# Altium footprint library con-samtec.PCBLIB: 805 footprints (part 5 of 55)
Each footprint in its own frame and in the unit in brackets; x right, y up, seen from the top. Pads: shape width x height; smd on the part's side, far side on the other; paste and mask are expansions set on the pad; w line width, h text height; cw(c..) or ccw(c..) is an arc to the next point about the centre after c.
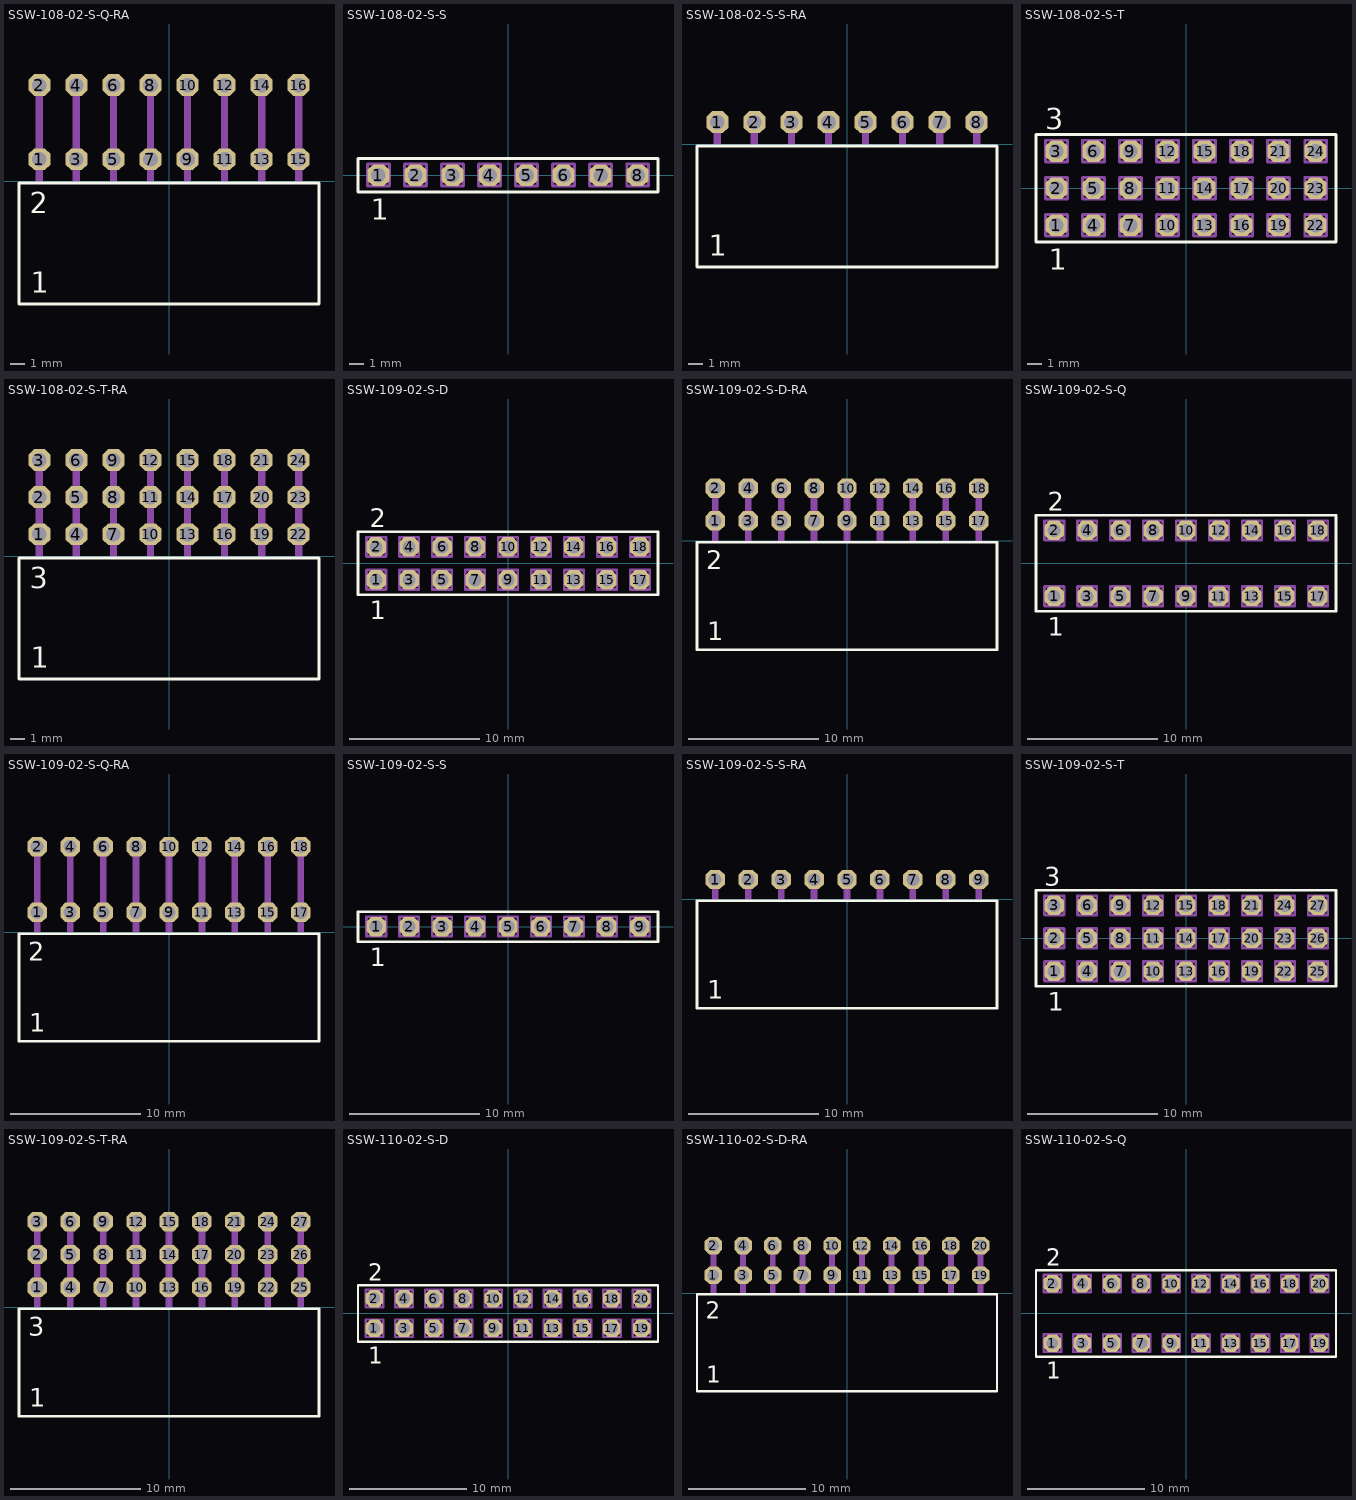
[diagram p4: the footprints below, top view; thin cyan lines are the x and y axes]

## SSW-108-02-S-Q-RA [mil]
pads (16):
  oct 59.06x59.06 hole 39.37: 1(-350,60) 2(-350,260) 3(-250,60) 4(-250,260) 5(-150,60) 6(-150,260) 7(-50,60) 8(-50,260) 9(50,60) 10(50,260) 11(150,60) 12(150,260) 13(250,60) 14(250,260) 15(350,60) 16(350,260)
Top Overlay:
  lines w8: -405.08,-330.55 405.08,-330.55 405.08,-4.17 -405.08,-4.17 -405.08,-330.55
  text "1" at -373.43,-301.18 h56.1
  text "2" at -376.38,-86.61 h56.1
Mechanical 16:
  rectangle: -360,0 -340,270
  rectangle: -260,0 -240,270
  rectangle: -160,0 -140,270
  rectangle: -60,0 -40,270
  rectangle: 40,0 60,270
  rectangle: 140,0 160,270
  rectangle: 240,0 260,270
  rectangle: 340,0 360,270

## SSW-108-02-S-S [mm]
pads (8):
  oct 1.5x1.5 hole 1: 1(-8.89,0) 2(-6.35,0) 3(-3.81,0) 4(-1.27,0) 5(1.27,0) 6(3.81,0) 7(6.35,0) 8(8.89,0)
Top Overlay:
  lines w0.203: -10.289,-1.155 10.289,-1.155 10.289,1.155 -10.289,1.155 -10.289,-1.155
  text "1" at -9.398,-3.048 h1.42
Mechanical 16:
  lines w0.203: -9.635,-0.745 -8.135,-0.745 -8.135,0.755 -9.635,0.755 -9.635,-0.745 ; -7.095,-0.745 -5.595,-0.745 -5.595,0.755 -7.095,0.755 -7.095,-0.745 ; -4.555,-0.745 -3.055,-0.745 -3.055,0.755 -4.555,0.755 -4.555,-0.745 ; -2.015,-0.745 -0.515,-0.745 -0.515,0.755 -2.015,0.755 -2.015,-0.745 ; 0.525,-0.745 2.025,-0.745 2.025,0.755 0.525,0.755 0.525,-0.745 ; 3.065,-0.745 4.565,-0.745 4.565,0.755 3.065,0.755 3.065,-0.745 ; 5.605,-0.745 7.105,-0.745 7.105,0.755 5.605,0.755 5.605,-0.745 ; 8.145,-0.745 9.645,-0.745 9.645,0.755 8.145,0.755 8.145,-0.745

## SSW-108-02-S-S-RA [mil]
pads (8):
  oct 59.06x59.06 hole 39.37: 1(-350,60) 2(-250,60) 3(-150,60) 4(-50,60) 5(50,60) 6(150,60) 7(250,60) 8(350,60)
Top Overlay:
  lines w8: -405.08,-330.55 405.08,-330.55 405.08,-4.17 -405.08,-4.17 -405.08,-330.55
  text "1" at -373.43,-301.18 h56.1
Mechanical 16:
  rectangle: -360,0 -340,70
  rectangle: -260,0 -240,70
  rectangle: -160,0 -140,70
  rectangle: -60,0 -40,70
  rectangle: 40,0 60,70
  rectangle: 140,0 160,70
  rectangle: 240,0 260,70
  rectangle: 340,0 360,70

## SSW-108-02-S-T [mm]
pads (24):
  oct 1.5x1.5 hole 1: 1(-8.89,-2.54) 2(-8.89,0) 3(-8.89,2.54) 4(-6.35,-2.54) 5(-6.35,0) 6(-6.35,2.54) 7(-3.81,-2.54) 8(-3.81,0) 9(-3.81,2.54) 10(-1.27,-2.54) 11(-1.27,0) 12(-1.27,2.54) 13(1.27,-2.54) 14(1.27,0) 15(1.27,2.54) 16(3.81,-2.54) 17(3.81,0) 18(3.81,2.54) 19(6.35,-2.54) 20(6.35,0) 21(6.35,2.54) 22(8.89,-2.54) 23(8.89,0) 24(8.89,2.54)
Top Overlay:
  lines w0.203: -10.289,-3.695 10.289,-3.695 10.289,3.695 -10.289,3.695 -10.289,-3.695
  text "1" at -9.398,-5.588 h1.42
  text "3" at -9.652,4.064 h1.42
Mechanical 16:
  lines w0.203: -9.635,-3.285 -8.135,-3.285 -8.135,-1.785 -9.635,-1.785 -9.635,-3.285 ; -9.635,-0.745 -8.135,-0.745 -8.135,0.755 -9.635,0.755 -9.635,-0.745 ; -9.635,1.795 -8.135,1.795 -8.135,3.295 -9.635,3.295 -9.635,1.795 ; -7.095,-3.285 -5.595,-3.285 -5.595,-1.785 -7.095,-1.785 -7.095,-3.285 ; -7.095,-0.745 -5.595,-0.745 -5.595,0.755 -7.095,0.755 -7.095,-0.745 ; -7.095,1.795 -5.595,1.795 -5.595,3.295 -7.095,3.295 -7.095,1.795 ; -4.555,-3.285 -3.055,-3.285 -3.055,-1.785 -4.555,-1.785 -4.555,-3.285 ; -4.555,-0.745 -3.055,-0.745 -3.055,0.755 -4.555,0.755 -4.555,-0.745 ; -4.555,1.795 -3.055,1.795 -3.055,3.295 -4.555,3.295 -4.555,1.795 ; -2.015,-3.285 -0.515,-3.285 -0.515,-1.785 -2.015,-1.785 -2.015,-3.285 ; -2.015,-0.745 -0.515,-0.745 -0.515,0.755 -2.015,0.755 -2.015,-0.745 ; -2.015,1.795 -0.515,1.795 -0.515,3.295 -2.015,3.295 -2.015,1.795 ; 0.525,-3.285 2.025,-3.285 2.025,-1.785 0.525,-1.785 0.525,-3.285 ; 0.525,-0.745 2.025,-0.745 2.025,0.755 0.525,0.755 0.525,-0.745 ; 0.525,1.795 2.025,1.795 2.025,3.295 0.525,3.295 0.525,1.795 ; 3.065,-3.285 4.565,-3.285 4.565,-1.785 3.065,-1.785 3.065,-3.285 ; 3.065,-0.745 4.565,-0.745 4.565,0.755 3.065,0.755 3.065,-0.745 ; 3.065,1.795 4.565,1.795 4.565,3.295 3.065,3.295 3.065,1.795 ; 5.605,-3.285 7.105,-3.285 7.105,-1.785 5.605,-1.785 5.605,-3.285 ; 5.605,-0.745 7.105,-0.745 7.105,0.755 5.605,0.755 5.605,-0.745 ; 5.605,1.795 7.105,1.795 7.105,3.295 5.605,3.295 5.605,1.795 ; 8.145,-3.285 9.645,-3.285 9.645,-1.785 8.145,-1.785 8.145,-3.285 ; 8.145,-0.745 9.645,-0.745 9.645,0.755 8.145,0.755 8.145,-0.745 ; 8.145,1.795 9.645,1.795 9.645,3.295 8.145,3.295 8.145,1.795

## SSW-108-02-S-T-RA [mil]
pads (24):
  oct 59.06x59.06 hole 39.37: 1(-350,60) 2(-350,160) 3(-350,260) 4(-250,60) 5(-250,160) 6(-250,260) 7(-150,60) 8(-150,160) 9(-150,260) 10(-50,60) 11(-50,160) 12(-50,260) 13(50,60) 14(50,160) 15(50,260) 16(150,60) 17(150,160) 18(150,260) 19(250,60) 20(250,160) 21(250,260) 22(350,60) 23(350,160) 24(350,260)
Top Overlay:
  lines w8: -405.08,-330.55 405.08,-330.55 405.08,-4.17 -405.08,-4.17 -405.08,-330.55
  text "1" at -373.43,-301.18 h56.1
  text "3" at -376.38,-86.61 h56.1
Mechanical 16:
  rectangle: -360,0 -340,270
  rectangle: -260,0 -240,270
  rectangle: -160,0 -140,270
  rectangle: -60,0 -40,270
  rectangle: 40,0 60,270
  rectangle: 140,0 160,270
  rectangle: 240,0 260,270
  rectangle: 340,0 360,270

## SSW-109-02-S-D [mm]
pads (18):
  oct 1.5x1.5 hole 1: 1(-10.16,-1.27) 2(-10.16,1.27) 3(-7.62,-1.27) 4(-7.62,1.27) 5(-5.08,-1.27) 6(-5.08,1.27) 7(-2.54,-1.27) 8(-2.54,1.27) 9(0,-1.27) 10(0,1.27) 11(2.54,-1.27) 12(2.54,1.27) 13(5.08,-1.27) 14(5.08,1.27) 15(7.62,-1.27) 16(7.62,1.27) 17(10.16,-1.27) 18(10.16,1.27)
Top Overlay:
  lines w0.203: -11.559,-2.425 11.559,-2.425 11.559,2.425 -11.559,2.425 -11.559,-2.425
  text "1" at -10.668,-4.318 h1.42
  text "2" at -10.668,2.794 h1.42
Mechanical 16:
  lines w0.203: -10.905,-2.015 -9.405,-2.015 -9.405,-0.515 -10.905,-0.515 -10.905,-2.015 ; -10.905,0.525 -9.405,0.525 -9.405,2.025 -10.905,2.025 -10.905,0.525 ; -8.365,-2.015 -6.865,-2.015 -6.865,-0.515 -8.365,-0.515 -8.365,-2.015 ; -8.365,0.525 -6.865,0.525 -6.865,2.025 -8.365,2.025 -8.365,0.525 ; -5.825,-2.015 -4.325,-2.015 -4.325,-0.515 -5.825,-0.515 -5.825,-2.015 ; -5.825,0.525 -4.325,0.525 -4.325,2.025 -5.825,2.025 -5.825,0.525 ; -3.285,-2.015 -1.785,-2.015 -1.785,-0.515 -3.285,-0.515 -3.285,-2.015 ; -3.285,0.525 -1.785,0.525 -1.785,2.025 -3.285,2.025 -3.285,0.525 ; -0.745,-2.015 0.755,-2.015 0.755,-0.515 -0.745,-0.515 -0.745,-2.015 ; -0.745,0.525 0.755,0.525 0.755,2.025 -0.745,2.025 -0.745,0.525 ; 1.795,-2.015 3.295,-2.015 3.295,-0.515 1.795,-0.515 1.795,-2.015 ; 1.795,0.525 3.295,0.525 3.295,2.025 1.795,2.025 1.795,0.525 ; 4.335,-2.015 5.835,-2.015 5.835,-0.515 4.335,-0.515 4.335,-2.015 ; 4.335,0.525 5.835,0.525 5.835,2.025 4.335,2.025 4.335,0.525 ; 6.875,-2.015 8.375,-2.015 8.375,-0.515 6.875,-0.515 6.875,-2.015 ; 6.875,0.525 8.375,0.525 8.375,2.025 6.875,2.025 6.875,0.525 ; 9.415,-2.015 10.915,-2.015 10.915,-0.515 9.415,-0.515 9.415,-2.015 ; 9.415,0.525 10.915,0.525 10.915,2.025 9.415,2.025 9.415,0.525

## SSW-109-02-S-D-RA [mil]
pads (18):
  oct 59.06x59.06 hole 39.37: 1(-400,60) 2(-400,160) 3(-300,60) 4(-300,160) 5(-200,60) 6(-200,160) 7(-100,60) 8(-100,160) 9(0,60) 10(0,160) 11(100,60) 12(100,160) 13(200,60) 14(200,160) 15(300,60) 16(300,160) 17(400,60) 18(400,160)
Top Overlay:
  lines w8: -455.08,-330.55 455.08,-330.55 455.08,-4.17 -455.08,-4.17 -455.08,-330.55
  text "1" at -423.43,-301.18 h56.1
  text "2" at -426.38,-86.61 h56.1
Mechanical 16:
  rectangle: -410,0 -390,170
  rectangle: -310,0 -290,170
  rectangle: -210,0 -190,170
  rectangle: -110,0 -90,170
  rectangle: -10,0 10,170
  rectangle: 90,0 110,170
  rectangle: 190,0 210,170
  rectangle: 290,0 310,170
  rectangle: 390,0 410,170

## SSW-109-02-S-Q [mm]
pads (18):
  oct 1.5x1.5 hole 1: 1(-10.16,-2.54) 2(-10.16,2.54) 3(-7.62,-2.54) 4(-7.62,2.54) 5(-5.08,-2.54) 6(-5.08,2.54) 7(-2.54,-2.54) 8(-2.54,2.54) 9(0,-2.54) 10(0,2.54) 11(2.54,-2.54) 12(2.54,2.54) 13(5.08,-2.54) 14(5.08,2.54) 15(7.62,-2.54) 16(7.62,2.54) 17(10.16,-2.54) 18(10.16,2.54)
Top Overlay:
  lines w0.203: -11.559,-3.695 11.559,-3.695 11.559,3.695 -11.559,3.695 -11.559,-3.695
  text "1" at -10.668,-5.588 h1.42
  text "2" at -10.668,4.064 h1.42
Mechanical 16:
  lines w0.203: -10.905,-3.285 -9.405,-3.285 -9.405,-1.785 -10.905,-1.785 -10.905,-3.285 ; -10.905,1.795 -9.405,1.795 -9.405,3.295 -10.905,3.295 -10.905,1.795 ; -8.365,-3.285 -6.865,-3.285 -6.865,-1.785 -8.365,-1.785 -8.365,-3.285 ; -8.365,1.795 -6.865,1.795 -6.865,3.295 -8.365,3.295 -8.365,1.795 ; -5.825,-3.285 -4.325,-3.285 -4.325,-1.785 -5.825,-1.785 -5.825,-3.285 ; -5.825,1.795 -4.325,1.795 -4.325,3.295 -5.825,3.295 -5.825,1.795 ; -3.285,-3.285 -1.785,-3.285 -1.785,-1.785 -3.285,-1.785 -3.285,-3.285 ; -3.285,1.795 -1.785,1.795 -1.785,3.295 -3.285,3.295 -3.285,1.795 ; -0.745,-3.285 0.755,-3.285 0.755,-1.785 -0.745,-1.785 -0.745,-3.285 ; -0.745,1.795 0.755,1.795 0.755,3.295 -0.745,3.295 -0.745,1.795 ; 1.795,-3.285 3.295,-3.285 3.295,-1.785 1.795,-1.785 1.795,-3.285 ; 1.795,1.795 3.295,1.795 3.295,3.295 1.795,3.295 1.795,1.795 ; 4.335,-3.285 5.835,-3.285 5.835,-1.785 4.335,-1.785 4.335,-3.285 ; 4.335,1.795 5.835,1.795 5.835,3.295 4.335,3.295 4.335,1.795 ; 6.875,-3.285 8.375,-3.285 8.375,-1.785 6.875,-1.785 6.875,-3.285 ; 6.875,1.795 8.375,1.795 8.375,3.295 6.875,3.295 6.875,1.795 ; 9.415,-3.285 10.915,-3.285 10.915,-1.785 9.415,-1.785 9.415,-3.285 ; 9.415,1.795 10.915,1.795 10.915,3.295 9.415,3.295 9.415,1.795

## SSW-109-02-S-Q-RA [mil]
pads (18):
  oct 59.06x59.06 hole 39.37: 1(-400,60) 2(-400,260) 3(-300,60) 4(-300,260) 5(-200,60) 6(-200,260) 7(-100,60) 8(-100,260) 9(0,60) 10(0,260) 11(100,60) 12(100,260) 13(200,60) 14(200,260) 15(300,60) 16(300,260) 17(400,60) 18(400,260)
Top Overlay:
  lines w8: -455.08,-330.55 455.08,-330.55 455.08,-4.17 -455.08,-4.17 -455.08,-330.55
  text "1" at -423.43,-301.18 h56.1
  text "2" at -426.38,-86.61 h56.1
Mechanical 16:
  rectangle: -410,0 -390,270
  rectangle: -310,0 -290,270
  rectangle: -210,0 -190,270
  rectangle: -110,0 -90,270
  rectangle: -10,0 10,270
  rectangle: 90,0 110,270
  rectangle: 190,0 210,270
  rectangle: 290,0 310,270
  rectangle: 390,0 410,270

## SSW-109-02-S-S [mm]
pads (9):
  oct 1.5x1.5 hole 1: 1(-10.16,0) 2(-7.62,0) 3(-5.08,0) 4(-2.54,0) 5(0,0) 6(2.54,0) 7(5.08,0) 8(7.62,0) 9(10.16,0)
Top Overlay:
  lines w0.203: -11.559,-1.155 11.559,-1.155 11.559,1.155 -11.559,1.155 -11.559,-1.155
  text "1" at -10.668,-3.048 h1.42
Mechanical 16:
  lines w0.203: -10.905,-0.745 -9.405,-0.745 -9.405,0.755 -10.905,0.755 -10.905,-0.745 ; -8.365,-0.745 -6.865,-0.745 -6.865,0.755 -8.365,0.755 -8.365,-0.745 ; -5.825,-0.745 -4.325,-0.745 -4.325,0.755 -5.825,0.755 -5.825,-0.745 ; -3.285,-0.745 -1.785,-0.745 -1.785,0.755 -3.285,0.755 -3.285,-0.745 ; -0.745,-0.745 0.755,-0.745 0.755,0.755 -0.745,0.755 -0.745,-0.745 ; 1.795,-0.745 3.295,-0.745 3.295,0.755 1.795,0.755 1.795,-0.745 ; 4.335,-0.745 5.835,-0.745 5.835,0.755 4.335,0.755 4.335,-0.745 ; 6.875,-0.745 8.375,-0.745 8.375,0.755 6.875,0.755 6.875,-0.745 ; 9.415,-0.745 10.915,-0.745 10.915,0.755 9.415,0.755 9.415,-0.745

## SSW-109-02-S-S-RA [mil]
pads (9):
  oct 59.06x59.06 hole 39.37: 1(-400,60) 2(-300,60) 3(-200,60) 4(-100,60) 5(0,60) 6(100,60) 7(200,60) 8(300,60) 9(400,60)
Top Overlay:
  lines w8: -455.08,-330.55 455.08,-330.55 455.08,-4.17 -455.08,-4.17 -455.08,-330.55
  text "1" at -423.43,-301.18 h56.1
Mechanical 16:
  rectangle: -410,0 -390,70
  rectangle: -310,0 -290,70
  rectangle: -210,0 -190,70
  rectangle: -110,0 -90,70
  rectangle: -10,0 10,70
  rectangle: 90,0 110,70
  rectangle: 190,0 210,70
  rectangle: 290,0 310,70
  rectangle: 390,0 410,70

## SSW-109-02-S-T [mm]
pads (27):
  oct 1.5x1.5 hole 1: 1(-10.16,-2.54) 2(-10.16,0) 3(-10.16,2.54) 4(-7.62,-2.54) 5(-7.62,0) 6(-7.62,2.54) 7(-5.08,-2.54) 8(-5.08,0) 9(-5.08,2.54) 10(-2.54,-2.54) 11(-2.54,0) 12(-2.54,2.54) 13(0,-2.54) 14(0,0) 15(0,2.54) 16(2.54,-2.54) 17(2.54,0) 18(2.54,2.54) 19(5.08,-2.54) 20(5.08,0) 21(5.08,2.54) 22(7.62,-2.54) 23(7.62,0) 24(7.62,2.54) 25(10.16,-2.54) 26(10.16,0) 27(10.16,2.54)
Top Overlay:
  lines w0.203: -11.559,-3.695 11.559,-3.695 11.559,3.695 -11.559,3.695 -11.559,-3.695
  text "1" at -10.668,-5.588 h1.42
  text "3" at -10.922,4.064 h1.42
Mechanical 16:
  lines w0.203: -10.905,-3.285 -9.405,-3.285 -9.405,-1.785 -10.905,-1.785 -10.905,-3.285 ; -10.905,-0.745 -9.405,-0.745 -9.405,0.755 -10.905,0.755 -10.905,-0.745 ; -10.905,1.795 -9.405,1.795 -9.405,3.295 -10.905,3.295 -10.905,1.795 ; -8.365,-3.285 -6.865,-3.285 -6.865,-1.785 -8.365,-1.785 -8.365,-3.285 ; -8.365,-0.745 -6.865,-0.745 -6.865,0.755 -8.365,0.755 -8.365,-0.745 ; -8.365,1.795 -6.865,1.795 -6.865,3.295 -8.365,3.295 -8.365,1.795 ; -5.825,-3.285 -4.325,-3.285 -4.325,-1.785 -5.825,-1.785 -5.825,-3.285 ; -5.825,-0.745 -4.325,-0.745 -4.325,0.755 -5.825,0.755 -5.825,-0.745 ; -5.825,1.795 -4.325,1.795 -4.325,3.295 -5.825,3.295 -5.825,1.795 ; -3.285,-3.285 -1.785,-3.285 -1.785,-1.785 -3.285,-1.785 -3.285,-3.285 ; -3.285,-0.745 -1.785,-0.745 -1.785,0.755 -3.285,0.755 -3.285,-0.745 ; -3.285,1.795 -1.785,1.795 -1.785,3.295 -3.285,3.295 -3.285,1.795 ; -0.745,-3.285 0.755,-3.285 0.755,-1.785 -0.745,-1.785 -0.745,-3.285 ; -0.745,-0.745 0.755,-0.745 0.755,0.755 -0.745,0.755 -0.745,-0.745 ; -0.745,1.795 0.755,1.795 0.755,3.295 -0.745,3.295 -0.745,1.795 ; 1.795,-3.285 3.295,-3.285 3.295,-1.785 1.795,-1.785 1.795,-3.285 ; 1.795,-0.745 3.295,-0.745 3.295,0.755 1.795,0.755 1.795,-0.745 ; 1.795,1.795 3.295,1.795 3.295,3.295 1.795,3.295 1.795,1.795 ; 4.335,-3.285 5.835,-3.285 5.835,-1.785 4.335,-1.785 4.335,-3.285 ; 4.335,-0.745 5.835,-0.745 5.835,0.755 4.335,0.755 4.335,-0.745 ; 4.335,1.795 5.835,1.795 5.835,3.295 4.335,3.295 4.335,1.795 ; 6.875,-3.285 8.375,-3.285 8.375,-1.785 6.875,-1.785 6.875,-3.285 ; 6.875,-0.745 8.375,-0.745 8.375,0.755 6.875,0.755 6.875,-0.745 ; 6.875,1.795 8.375,1.795 8.375,3.295 6.875,3.295 6.875,1.795 ; 9.415,-3.285 10.915,-3.285 10.915,-1.785 9.415,-1.785 9.415,-3.285 ; 9.415,-0.745 10.915,-0.745 10.915,0.755 9.415,0.755 9.415,-0.745 ; 9.415,1.795 10.915,1.795 10.915,3.295 9.415,3.295 9.415,1.795

## SSW-109-02-S-T-RA [mil]
pads (27):
  oct 59.06x59.06 hole 39.37: 1(-400,60) 2(-400,160) 3(-400,260) 4(-300,60) 5(-300,160) 6(-300,260) 7(-200,60) 8(-200,160) 9(-200,260) 10(-100,60) 11(-100,160) 12(-100,260) 13(0,60) 14(0,160) 15(0,260) 16(100,60) 17(100,160) 18(100,260) 19(200,60) 20(200,160) 21(200,260) 22(300,60) 23(300,160) 24(300,260) 25(400,60) 26(400,160) 27(400,260)
Top Overlay:
  lines w8: -455.08,-330.55 455.08,-330.55 455.08,-4.17 -455.08,-4.17 -455.08,-330.55
  text "1" at -423.43,-301.18 h56.1
  text "3" at -426.38,-86.61 h56.1
Mechanical 16:
  rectangle: -410,0 -390,270
  rectangle: -310,0 -290,270
  rectangle: -210,0 -190,270
  rectangle: -110,0 -90,270
  rectangle: -10,0 10,270
  rectangle: 90,0 110,270
  rectangle: 190,0 210,270
  rectangle: 290,0 310,270
  rectangle: 390,0 410,270

## SSW-110-02-S-D [mm]
pads (20):
  oct 1.5x1.5 hole 1: 1(-11.43,-1.27) 2(-11.43,1.27) 3(-8.89,-1.27) 4(-8.89,1.27) 5(-6.35,-1.27) 6(-6.35,1.27) 7(-3.81,-1.27) 8(-3.81,1.27) 9(-1.27,-1.27) 10(-1.27,1.27) 11(1.27,-1.27) 12(1.27,1.27) 13(3.81,-1.27) 14(3.81,1.27) 15(6.35,-1.27) 16(6.35,1.27) 17(8.89,-1.27) 18(8.89,1.27) 19(11.43,-1.27) 20(11.43,1.27)
Top Overlay:
  lines w0.203: -12.829,-2.425 12.829,-2.425 12.829,2.425 -12.829,2.425 -12.829,-2.425
  text "1" at -11.938,-4.318 h1.42
  text "2" at -11.938,2.794 h1.42
Mechanical 16:
  lines w0.203: -12.175,-2.015 -10.675,-2.015 -10.675,-0.515 -12.175,-0.515 -12.175,-2.015 ; -12.175,0.525 -10.675,0.525 -10.675,2.025 -12.175,2.025 -12.175,0.525 ; -9.635,-2.015 -8.135,-2.015 -8.135,-0.515 -9.635,-0.515 -9.635,-2.015 ; -9.635,0.525 -8.135,0.525 -8.135,2.025 -9.635,2.025 -9.635,0.525 ; -7.095,-2.015 -5.595,-2.015 -5.595,-0.515 -7.095,-0.515 -7.095,-2.015 ; -7.095,0.525 -5.595,0.525 -5.595,2.025 -7.095,2.025 -7.095,0.525 ; -4.555,-2.015 -3.055,-2.015 -3.055,-0.515 -4.555,-0.515 -4.555,-2.015 ; -4.555,0.525 -3.055,0.525 -3.055,2.025 -4.555,2.025 -4.555,0.525 ; -2.015,-2.015 -0.515,-2.015 -0.515,-0.515 -2.015,-0.515 -2.015,-2.015 ; -2.015,0.525 -0.515,0.525 -0.515,2.025 -2.015,2.025 -2.015,0.525 ; 0.525,-2.015 2.025,-2.015 2.025,-0.515 0.525,-0.515 0.525,-2.015 ; 0.525,0.525 2.025,0.525 2.025,2.025 0.525,2.025 0.525,0.525 ; 3.065,-2.015 4.565,-2.015 4.565,-0.515 3.065,-0.515 3.065,-2.015 ; 3.065,0.525 4.565,0.525 4.565,2.025 3.065,2.025 3.065,0.525 ; 5.605,-2.015 7.105,-2.015 7.105,-0.515 5.605,-0.515 5.605,-2.015 ; 5.605,0.525 7.105,0.525 7.105,2.025 5.605,2.025 5.605,0.525 ; 8.145,-2.015 9.645,-2.015 9.645,-0.515 8.145,-0.515 8.145,-2.015 ; 8.145,0.525 9.645,0.525 9.645,2.025 8.145,2.025 8.145,0.525 ; 10.685,-2.015 12.185,-2.015 12.185,-0.515 10.685,-0.515 10.685,-2.015 ; 10.685,0.525 12.185,0.525 12.185,2.025 10.685,2.025 10.685,0.525

## SSW-110-02-S-D-RA [mil]
pads (20):
  oct 59.06x59.06 hole 39.37: 1(-450,60) 2(-450,160) 3(-350,60) 4(-350,160) 5(-250,60) 6(-250,160) 7(-150,60) 8(-150,160) 9(-50,60) 10(-50,160) 11(50,60) 12(50,160) 13(150,60) 14(150,160) 15(250,60) 16(250,160) 17(350,60) 18(350,160) 19(450,60) 20(450,160)
Top Overlay:
  lines w8: -505.08,-330.55 505.08,-330.55 505.08,-4.17 -505.08,-4.17 -505.08,-330.55
  text "1" at -473.43,-301.18 h56.1
  text "2" at -476.38,-86.61 h56.1
Mechanical 16:
  rectangle: -460,0 -440,170
  rectangle: -360,0 -340,170
  rectangle: -260,0 -240,170
  rectangle: -160,0 -140,170
  rectangle: -60,0 -40,170
  rectangle: 40,0 60,170
  rectangle: 140,0 160,170
  rectangle: 240,0 260,170
  rectangle: 340,0 360,170
  rectangle: 440,0 460,170

## SSW-110-02-S-Q [mm]
pads (20):
  oct 1.5x1.5 hole 1: 1(-11.43,-2.54) 2(-11.43,2.54) 3(-8.89,-2.54) 4(-8.89,2.54) 5(-6.35,-2.54) 6(-6.35,2.54) 7(-3.81,-2.54) 8(-3.81,2.54) 9(-1.27,-2.54) 10(-1.27,2.54) 11(1.27,-2.54) 12(1.27,2.54) 13(3.81,-2.54) 14(3.81,2.54) 15(6.35,-2.54) 16(6.35,2.54) 17(8.89,-2.54) 18(8.89,2.54) 19(11.43,-2.54) 20(11.43,2.54)
Top Overlay:
  lines w0.203: -12.829,-3.695 12.829,-3.695 12.829,3.695 -12.829,3.695 -12.829,-3.695
  text "1" at -11.938,-5.588 h1.42
  text "2" at -11.938,4.064 h1.42
Mechanical 16:
  lines w0.203: -12.175,-3.285 -10.675,-3.285 -10.675,-1.785 -12.175,-1.785 -12.175,-3.285 ; -12.175,1.795 -10.675,1.795 -10.675,3.295 -12.175,3.295 -12.175,1.795 ; -9.635,-3.285 -8.135,-3.285 -8.135,-1.785 -9.635,-1.785 -9.635,-3.285 ; -9.635,1.795 -8.135,1.795 -8.135,3.295 -9.635,3.295 -9.635,1.795 ; -7.095,-3.285 -5.595,-3.285 -5.595,-1.785 -7.095,-1.785 -7.095,-3.285 ; -7.095,1.795 -5.595,1.795 -5.595,3.295 -7.095,3.295 -7.095,1.795 ; -4.555,-3.285 -3.055,-3.285 -3.055,-1.785 -4.555,-1.785 -4.555,-3.285 ; -4.555,1.795 -3.055,1.795 -3.055,3.295 -4.555,3.295 -4.555,1.795 ; -2.015,-3.285 -0.515,-3.285 -0.515,-1.785 -2.015,-1.785 -2.015,-3.285 ; -2.015,1.795 -0.515,1.795 -0.515,3.295 -2.015,3.295 -2.015,1.795 ; 0.525,-3.285 2.025,-3.285 2.025,-1.785 0.525,-1.785 0.525,-3.285 ; 0.525,1.795 2.025,1.795 2.025,3.295 0.525,3.295 0.525,1.795 ; 3.065,-3.285 4.565,-3.285 4.565,-1.785 3.065,-1.785 3.065,-3.285 ; 3.065,1.795 4.565,1.795 4.565,3.295 3.065,3.295 3.065,1.795 ; 5.605,-3.285 7.105,-3.285 7.105,-1.785 5.605,-1.785 5.605,-3.285 ; 5.605,1.795 7.105,1.795 7.105,3.295 5.605,3.295 5.605,1.795 ; 8.145,-3.285 9.645,-3.285 9.645,-1.785 8.145,-1.785 8.145,-3.285 ; 8.145,1.795 9.645,1.795 9.645,3.295 8.145,3.295 8.145,1.795 ; 10.685,-3.285 12.185,-3.285 12.185,-1.785 10.685,-1.785 10.685,-3.285 ; 10.685,1.795 12.185,1.795 12.185,3.295 10.685,3.295 10.685,1.795